# Altium footprint library eagle_tubes_v6.PCBLIB: 18 footprints (part 2 of 2)
Each footprint in its own frame and in the unit in brackets; x right, y up, seen from the top. Pads: shape width x height; smd on the part's side, far side on the other; paste and mask are expansions set on the pad; w line width, h text height; cw(c..) or ccw(c..) is an arc to the next point about the centre after c.
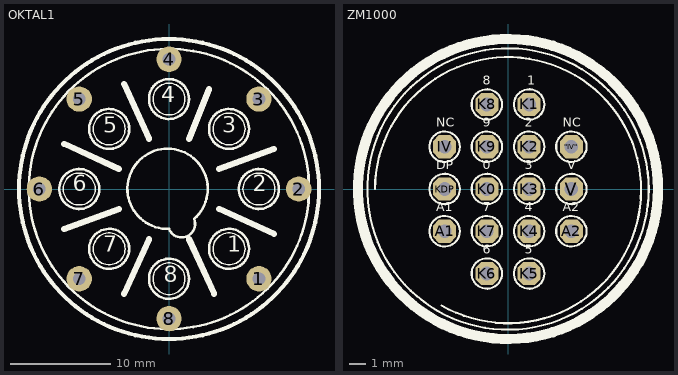
[diagram p1: the footprints below, top view; thin cyan lines are the x and y axes]

## OKTAL1 [mil]
pads (8):
  round 100 hole 50: 1(355,-354.33) 2(512,0) 3(355,355) 4(0,512) 5(-354.33,355) 6(-511.81,0) 7(-354.33,-354.33) 8(0,-511.81)
Top Overlay:
  circle w16: c0,0 r592
  circle w10: c0,0 r553
  circle w10: c-354.33,0 r79
  circle w10: c355,0 r79
  circle w10: c0,-354.33 r79
  circle w10: c0,355 r79
  circle w10: c-236.22,-236.22 r79
  circle w10: c-236.22,237 r79
  circle w10: c237,237 r79
  circle w10: c237,-236.22 r79
  circle w5: c-236.22,237 r63
  circle w5: c0,355 r63
  circle w5: c237,237 r63
  circle w5: c355,0 r63
  circle w5: c237,-236.22 r63
  circle w5: c0,-354.33 r63
  circle w5: c-236.22,-236.22 r63
  circle w5: c-354.33,0 r63
  lines w10: 0,-157.48 cw(c-5.62,0.8) 99,-118.11 cw(c49.5,-137.8) 0,-157.48
  lines w24: -413.39,-157.48 -196.85,-78.74 ; -413.39,178 -196.85,79 ; -177.17,-413.39 -78.74,-196.85 ; -177.17,414 -78.74,197 ; 79,-196.85 178,-413.39 ; 79,197 158,394 ; 197,-78.74 414,-177.17 ; 197,79 414,158
  text "1" at 230,-270 h108.5
  text "2" at 330,-30 h108.5
  text "3" at 210,200 h108.5
  text "4" at -30,320 h108.5
  text "5" at -260,200 h108.5
  text "6" at -380,-30 h108.5
  text "7" at -260,-270 h108.5
  text "8" at -20,-390 h108.5

## ZM1000 [mil]
pads (16):
  oct 55x55 hole 32: "\"IV\""(150,100) A1(-150,-100) A2(150,-100) IV(-150,100) K0(-50,0) K1(50,200) K2(50,100) K3(50,0) K4(50,-100) K5(50,-200) K6(-50,-200) K7(-50,-100) K8(-50,200) K9(-50,100) KDP(-150,0) V(150,0)
Top Overlay:
  circle w24: c0,0 r355
  circle w5: c-50,200 r36
  circle w5: c50,200 r36
  circle w5: c150,100 r36
  circle w5: c50,100 r36
  circle w5: c-50,100 r36
  circle w5: c-150,100 r36
  circle w5: c-150,0 r36
  circle w5: c-150,-100 r36
  circle w5: c-50,0 r36
  circle w5: c50,0 r36
  circle w5: c150,0 r36
  circle w5: c50,-100 r36
  circle w5: c-50,-100 r36
  circle w5: c-50,-200 r36
  circle w5: c50,-200 r36
  circle w5: c150,-100 r36
  circle w5: c0,0 r333
  lines w5: -314.96,0 cw(c0,-2.81) -157.48,-275.59
  text "8" at -60,240 h37.2
  text "1" at 45,240 h37.2
  text "9" at -60,140 h37.2
  text "2" at 40,140 h37.2
  text "DP" at -170,40 h37.2
  text "0" at -60,40 h37.2
  text "3" at 40,40 h37.2
  text "V" at 140,40 h37.2
  text "A1" at -170,-60 h37.2
  text "7" at -60,-60 h37.2
  text "4" at 40,-60 h37.2
  text "A2" at 130,-60 h37.2
  text "6" at -60,-160 h37.2
  text "5" at 40,-160 h37.2
  text "NC" at -170,140 h37.2
  text "NC" at 130,140 h37.2